# Altium footprint library CONNECTORS.PcbLib: 55 footprints (part 2 of 4)
Each footprint in its own frame and in the unit in brackets; x right, y up, seen from the top. Pads: shape width x height; smd on the part's side, far side on the other; paste and mask are expansions set on the pad; w line width, h text height; cw(c..) or ccw(c..) is an arc to the next point about the centre after c.
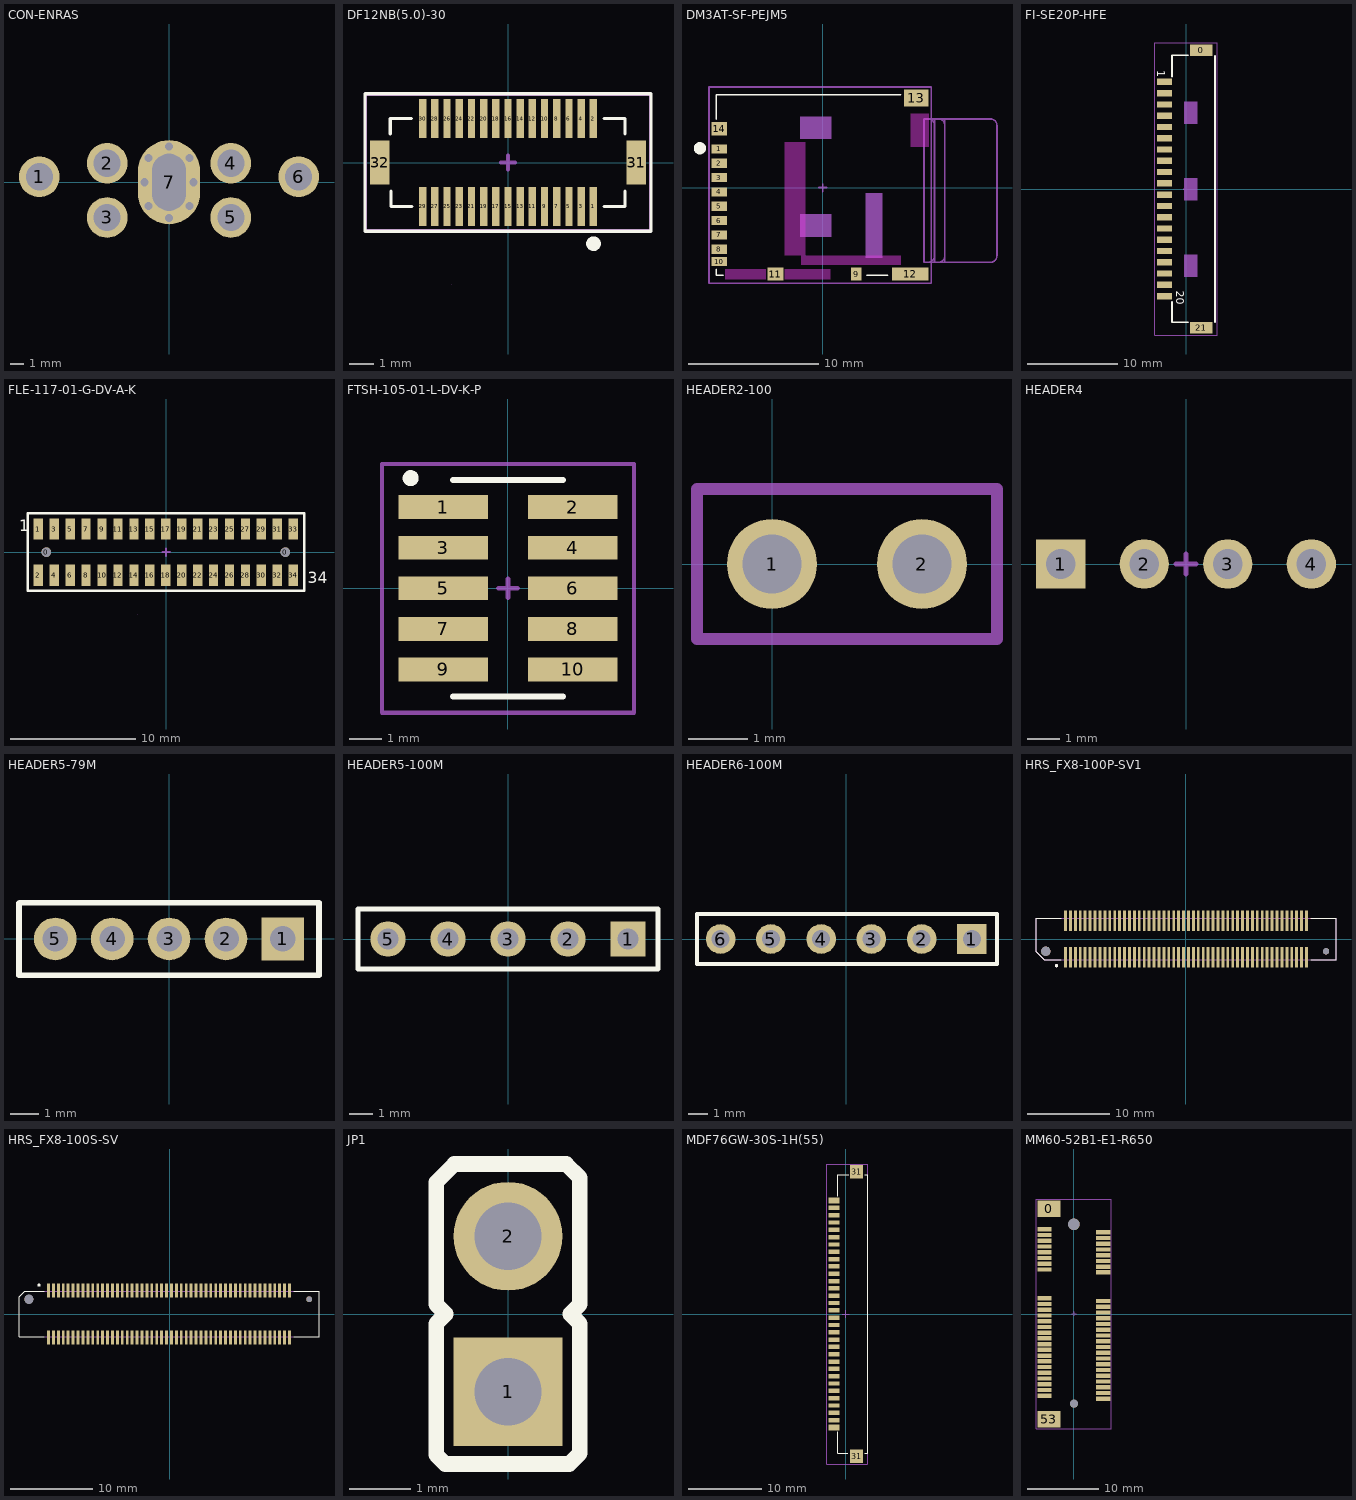
[diagram p1: the footprints below, top view; thin cyan lines are the x and y axes]

## CON-ENRAS [mm]
pads (15):
  round 3 hole 2: 1(-9.56,0.4) 2(-4.56,1.4) 3(-4.56,-2.6) 4(4.56,1.4) 5(4.56,-2.6) 6(9.56,0.4)
  round 0 hole 0.6: 7(-1.803,0) 7(-1.524,-1.753) 7(-1.524,1.778) 7(0,-2.642) 7(0,2.642) 7(1.524,-1.753) 7(1.524,1.778) 7(1.803,0)
  oval 4.6x6.2 hole 4.2 slot 2.5 at 0 deg: 7(0,0)
Bottom Component Center:
  lines w0.152: -0.5,0 0.5,0 ; 0,-0.5 0,0.5

## DF12NB(5.0)-30 [mm]
pads (32):
  rect 0.3x1.6 smd: 1(3.5,-1.8) 2(3.5,1.8) 3(3,-1.8) 4(3,1.8) 5(2.5,-1.8) 6(2.5,1.8) 7(2,-1.8) 8(2,1.8) 9(1.5,-1.8) 10(1.5,1.8) 11(1,-1.8) 12(1,1.8) 13(0.5,-1.8) 14(0.5,1.8) 15(0,-1.8) 16(0,1.8) 17(-0.5,-1.8) 18(-0.5,1.8) 19(-1,-1.8) 20(-1,1.8) 21(-1.5,-1.8) 22(-1.5,1.8) 23(-2,-1.8) 24(-2,1.8) 25(-2.5,-1.8) 26(-2.5,1.8) 27(-3,-1.8) 28(-3,1.8) 29(-3.5,-1.8) 30(-3.5,1.8)
  rect 0.8x1.8 smd: 31(5.25,0) 32(-5.25,0)
Top Overlay:
  circle w0.4: c3.505,-3.327 r0.1
  lines w0.127: -4.826,1.168 -4.826,1.803 -3.962,1.803 ; -4.801,-1.168 -4.801,-1.803 -3.937,-1.803 ; 3.937,-1.803 4.801,-1.803 4.801,-1.168 ; 3.937,1.803 4.801,1.803 4.801,1.168 ; -5.867,-2.819 -5.867,2.819 5.867,2.819 5.867,-2.819 -5.867,-2.819
Top Assembly (Mech4):
  lines w0.127: -5.842,-2.794 -5.842,2.794 5.842,2.794 5.842,-2.794 -5.842,-2.794
  text ".Designator" at -3.275,-0.4 h1
Top Component Center (Mech11):
  lines w0.15: -0.298,0 0.302,0 ; 0.002,-0.3 0.002,0.3
Mechanical 12:
  lines w0.001: -2.315,-4.991 -2.308,-4.984
3D body "DF12NB(5.0)-30DP.STEP": height 4.3, standoff 0, extent -5.3,-2.3 5.3,2.3

## DM3AT-SF-PEJM5 [mm]
pads (14):
  rect 1.2x0.7 smd: 1(-7.93,2.973) 2(-7.93,1.873) 3(-7.93,0.773) 4(-7.93,-0.327) 5(-7.93,-1.427) 6(-7.93,-2.527) 7(-7.93,-3.627) 8(-7.93,-4.727) 10(-7.93,-5.677)
  rect 0.8x1 smd: 9(2.57,-6.627)
  rect 1.2x1 smd: 11(-3.63,-6.627) 14(-7.93,4.523)
  rect 2.8x1 smd: 12(6.72,-6.627)
  rect 1.9x1.3 smd: 13(7.17,6.873)
Top Layer keep-out:
  region: -2.905,-7.031 -2.905,-6.277 0.575,-6.277 0.575,-7.031
  region: -7.48,-7.04 -7.48,-6.277 -4.38,-6.277 -4.38,-7.04
  region: -1.63,-5.933 -1.63,-5.227 5.985,-5.227 5.985,-5.933
  region: -2.93,-5.177 -2.93,3.473 -1.326,3.473 -1.326,-5.177
  region: 6.77,3.124 6.77,5.673 8.127,5.673 8.127,3.124
Top Overlay:
  circle w0.5: c-9.43,3.023 r0.22
  lines w0.127: -8.18,-6.277 -8.18,-6.727 -7.63,-6.727 ; -8.18,5.273 -8.18,7.123 5.97,7.123 ; 3.37,-6.727 4.97,-6.727
Top Assembly:
  lines w0.127: -8.725,-7.325 8.325,-7.325 8.325,7.725 -8.725,7.725 -8.725,-7.325
  text ".Designator" at -3.925,-0.225 h1.2
Top Component Center:
  lines w0.15: -0.3,-0.002 0.3,-0.002 ; 0,-0.302 0,0.298
Top Glue Points:
  rectangle: -1.73,-3.777 0.67,-2.027
  rectangle: 3.28,-5.402 4.58,-0.402
  rectangle: -1.73,3.723 0.67,5.473
Top Auxiliary Drawings:
  lines w0.127: 7.77,5.273 8.07,5.273 ; 8.075,-5.725 ccw(c8.075,-5.225) 8.575,-5.225 ; 8.075,-5.725 8.575,-5.725 ; 8.075,-5.725 7.775,-5.725 7.775,5.275 8.075,5.275 ; 8.075,5.275 cw(c8.075,4.775) 8.575,4.775 ; 8.075,5.275 8.575,5.275 ; 8.575,-5.725 8.875,-5.725 ; 8.575,-5.725 8.575,-5.225 ; 8.575,-5.225 8.575,4.775 ; 8.575,4.775 8.575,5.275 ; 8.575,5.275 8.875,5.275 ; 8.875,-5.725 ccw(c8.875,-5.225) 9.375,-5.225 ; 8.875,-5.725 9.375,-5.725 ; 8.875,5.275 cw(c8.875,4.775) 9.375,4.775 ; 8.875,5.275 9.375,5.275 ; 9.375,-5.725 9.375,-5.225 ; 9.375,-5.725 12.875,-5.725 ccw(c12.875,-5.225) 13.375,-5.225 13.375,4.775 ccw(c12.875,4.775) 12.875,5.275 9.375,5.275 ; 9.375,-5.225 9.375,4.775 ; 9.375,4.775 9.375,5.275
3D body "DM3AT-SF-PEJM5.STEP": height 1.63, standoff -0.05, extent -8.144,-6.733 8.006,7.117

## FI-SE20P-HFE [mm]
pads (22):
  rect 2.5x1.25 smd: 0(1.7,15.4) 21(1.7,-15.35)
  rect 1.7x0.7 smd: 1(-2.4,11.9) 2(-2.4,10.65) 3(-2.4,9.4) 4(-2.4,8.15) 5(-2.4,6.9) 6(-2.4,5.65) 7(-2.4,4.4) 8(-2.4,3.15) 9(-2.4,1.9) 10(-2.4,0.65) 11(-2.4,-0.6) 12(-2.4,-1.85) 13(-2.4,-3.1) 14(-2.4,-4.35) 15(-2.4,-5.6) 16(-2.4,-6.85) 17(-2.4,-8.1) 18(-2.4,-9.35) 19(-2.4,-10.6) 20(-2.4,-11.85)
Top Overlay:
  lines w0.2: -1.55,-12.475 -1.55,-14.75 0.225,-14.75 ; -1.55,12.5 -1.55,14.85 0.225,14.85 ; 3.2,-14.725 3.2,14.75
  text "20" at -1.099,-11.269 h0.9
  text "1" at -3.203,13.193 h0.9
Top Assembly:
  lines w0.127: -3.45,-16.175 3.425,-16.175 3.425,16.225 -3.45,16.225 -3.45,-16.175
  text ".Designator" at 0.35,4.525 h1
Top Component Center:
  lines w0.15: -0.3,-0.002 0.3,-0.002 ; 0,-0.302 0,0.298
Top Glue Points:
  rectangle: -0.25,-1.25 1.25,1.25
  rectangle: -0.25,7.25 1.25,9.75
  rectangle: -0.25,-9.75 1.25,-7.25
3D body "FI-SE20P-HFE.STEP": height 2.09, standoff -0.02, extent -2.35,-15.375 3,15.375

## FLE-117-01-G-DV-A-K [mil]
pads (36):
  round 30 hole 30 unplated: 0(-375.98,0) 0(374.02,0)
  rect 29x66 smd: 1(-400.98,72.5) 2(-400.98,-72.5) 3(-350.98,72.5) 4(-350.98,-72.5) 5(-300.98,72.5) 6(-300.98,-72.5) 7(-250.98,72.5) 8(-250.98,-72.5) 9(-200.98,72.5) 10(-200.98,-72.5) 11(-150.98,72.5) 12(-150.98,-72.5) 13(-100.98,72.5) 14(-100.98,-72.5) 15(-50.98,72.5) 16(-50.98,-72.5) 17(-0.98,72.5) 18(-0.98,-72.5) 19(49.02,72.5) 20(49.02,-72.5) 21(99.02,72.5) 22(99.02,-72.5) 23(149.02,72.5) 24(149.02,-72.5) 25(199.02,72.5) 26(199.02,-72.5) 27(249.02,72.5) 28(249.02,-72.5) 29(299.02,72.5) 30(299.02,-72.5) 31(349.02,72.5) 32(349.02,-72.5) 33(399.02,72.5) 34(399.02,-72.5)
Top Overlay:
  lines w7.87: -434.06,-121.06 433.07,-121.06 433.07,122.05 -434.06,122.05 -434.06,-121.06
  text "1" at -461.61,64.96 h35
  text "34" at 444.88,-97.44 h35
Top Assembly:
  lines w5: -434.06,-121.06 433.07,-121.06 433.07,122.05 -434.06,122.05 -434.06,-121.06
  text ".Designator" at -128.94,-15.75 h39.37
Top Component Center:
  lines w5.91: -11.73,0 11.89,0 ; 0.08,-11.81 0.08,11.81
Mechanical 12:
  lines w0.04: -91.14,-196.48 -90.88,-196.22
3D body "FLE-117-01-G-DV-A-K.stp": height 182.91, standoff -24.09, extent -427.25,-90.45 427.25,90.45

## FTSH-105-01-L-DV-K-P [mm]
pads (10):
  rect 2.8x0.75 smd: 1(-2.03,2.54) 2(2.03,2.54) 3(-2.03,1.27) 4(2.03,1.27) 5(-2.03,0) 6(2.03,0) 7(-2.03,-1.27) 8(2.03,-1.27) 9(-2.03,-2.54) 10(2.03,-2.54)
Top Overlay:
  circle w0.25: c-3.05,3.45 r0.125
  lines w0.2: -1.715,-3.391 1.715,-3.391 ; -1.715,3.391 1.715,3.391
Top Assembly:
  lines w0.127: -3.95,-3.9 -3.95,3.9 3.95,3.9 3.95,-3.9 -3.95,-3.9
  text ".Designator" at -0.381,1.524 h1
Top Component Center:
  lines w0.15: -0.298,0 0.302,0 ; 0.002,-0.3 0.002,0.3
Mechanical 12:
  lines w0.001: -2.54,-1.08 -1.715,-1.08 ; -2.54,1.08 -1.715,1.08 ; -1.715,-3.391 1.715,-3.391 ; -1.715,3.384 -1.708,3.391 1.715,3.391
Mechanical 13:
  lines w0.1: -2.54,-1.08 -1.715,-1.08 ; -2.54,1.08 -1.715,1.08 ; -1.715,-3.391 1.715,-3.391 ; -1.708,3.391 1.715,3.391 ; 1.708,-3.391 1.715,-3.384
3D body "FTSH-105-01-L-DV-K-P.stp": height 6.98, standoff -0.01, extent -2.921,-3.175 2.921,3.175

## HEADER2-100 [mil]
pads (2):
  round 60 hole 39.37: 1(0,0) 2(100,0)
Top Assembly:
  lines w7.87: -50,-50 -50,50 150,50 150,-50 -50,-50
3D body "61300211121_rev1.stp": height 336.22, standoff -118.11, extent -49.99,-50 150.01,50

## HEADER4 [mm]
pads (4):
  rect 1.5x1.5 hole 0.9: 1(-3.812,0)
  round 1.5 hole 0.9: 2(-1.272,0) 3(1.268,0) 4(3.808,0)
Top Component Center:
  lines w0.15: -0.302,0 0.298,0 ; -0.002,-0.3 -0.002,0.3

## HEADER5-79M [mm]
pads (5):
  rect 1.5x1.5 hole 0.9: 1(4,0)
  round 1.5 hole 0.9: 2(2,0) 3(0,0) 4(-2,0) 5(-4,0)
Top Overlay:
  lines w0.2: -5.275,-1.275 5.27,-1.275 5.27,1.27 -5.255,1.27 -5.275,1.25 -5.275,-1.275

## HEADER5-100M [mm]
pads (5):
  rect 1.5x1.5 hole 0.9: 1(5.08,0)
  round 1.5 hole 0.9: 2(2.54,0) 3(0,0) 4(-2.54,0) 5(-5.08,0)
Top Overlay:
  lines w0.2: -6.35,-1.27 6.35,-1.27 6.35,1.27 -6.35,1.27 -6.35,-1.27

## HEADER6-100M [mm]
pads (6):
  rect 1.5x1.5 hole 0.9: 1(6.35,0)
  round 1.5 hole 0.9: 2(3.81,0) 3(1.27,0) 4(-1.27,0) 5(-3.81,0) 6(-6.35,0)
Top Overlay:
  lines w0.2: -7.544,-1.27 -7.544,1.27 7.62,1.27 7.62,-1.27 -7.544,-1.27

## HRS_FX8-100P-SV1 [mm] "100 Position Connector Header, Outer Shroud Contacts Surface Mount Gold"
pads (102):
  rect 0.35x2.45 smd: 1(-14.7,-2.225) 2(-14.7,2.225) 3(-14.1,-2.225) 4(-14.1,2.225) 5(-13.5,-2.225) 6(-13.5,2.225) 7(-12.9,-2.225) 8(-12.9,2.225) 9(-12.3,-2.225) 10(-12.3,2.225) 11(-11.7,-2.225) 12(-11.7,2.225) 13(-11.1,-2.225) 14(-11.1,2.225) 15(-10.5,-2.225) 16(-10.5,2.225) 17(-9.9,-2.225) 18(-9.9,2.225) 19(-9.3,-2.225) 20(-9.3,2.225) 21(-8.7,-2.225) 22(-8.7,2.225) 23(-8.1,-2.225) 24(-8.1,2.225) 25(-7.5,-2.225) 26(-7.5,2.225) 27(-6.9,-2.225) 28(-6.9,2.225) 29(-6.3,-2.225) 30(-6.3,2.225) 31(-5.7,-2.225) 32(-5.7,2.225) 33(-5.1,-2.225) 34(-5.1,2.225) 35(-4.5,-2.225) 36(-4.5,2.225) 37(-3.9,-2.225) 38(-3.9,2.225) 39(-3.3,-2.225) 40(-3.3,2.225) 41(-2.7,-2.225) 42(-2.7,2.225) 43(-2.1,-2.225) 44(-2.1,2.225) 45(-1.5,-2.225) 46(-1.5,2.225) 47(-0.9,-2.225) 48(-0.9,2.225) 49(-0.3,-2.225) 50(-0.3,2.225) 51(0.3,-2.225) 52(0.3,2.225) 53(0.9,-2.225) 54(0.9,2.225) 55(1.5,-2.225) 56(1.5,2.225) 57(2.1,-2.225) 58(2.1,2.225) 59(2.7,-2.225) 60(2.7,2.225) 61(3.3,-2.225) 62(3.3,2.225) 63(3.9,-2.225) 64(3.9,2.225) 65(4.5,-2.225) 66(4.5,2.225) 67(5.1,-2.225) 68(5.1,2.225) 69(5.7,-2.225) 70(5.7,2.225) 71(6.3,-2.225) 72(6.3,2.225) 73(6.9,-2.225) 74(6.9,2.225) 75(7.5,-2.225) 76(7.5,2.225) 77(8.1,-2.225) 78(8.1,2.225) 79(8.7,-2.225) 80(8.7,2.225) 81(9.3,-2.225) 82(9.3,2.225) 83(9.9,-2.225) 84(9.9,2.225) 85(10.5,-2.225) 86(10.5,2.225) 87(11.1,-2.225) 88(11.1,2.225) 89(11.7,-2.225) 90(11.7,2.225) 91(12.3,-2.225) 92(12.3,2.225) 93(12.9,-2.225) 94(12.9,2.225) 95(13.5,-2.225) 96(13.5,2.225) 97(14.1,-2.225) 98(14.1,2.225) 99(14.7,-2.225) 100(14.7,2.225)
  round 1.15 hole 1.15 unplated: ""(-17.1,-1.5)
  round 0.75 hole 0.75 unplated: ""(17.1,-1.5)
Top Layer:
  lines w0.1: 15.212,2.552 15.852,2.552
Top Overlay:
  circle w0.2: c-15.798,-3.248 r0.1
  lines w0.127: -15.21,-2.55 -17.3,-2.55 -18.3,-1.55 -18.3,2.55 -15.21,2.55 ; 15.21,-2.55 18.3,-2.55 18.3,2.55 15.21,2.55
Mechanical 13:
  circle w0.2: c-15.798,-3.248 r0.1
  lines w0.127: -18.3,-1.55 -17.3,-2.55 18.3,-2.55 18.3,2.55 -18.3,2.55 -18.3,-1.55
3D body "FX8-100P-SV1.STEP": height 3.77, standoff -0.89, extent -18.3,-3.25 18.3,3.25

## HRS_FX8-100S-SV [mm] "100 Position Connector Receptacle, Center Strip Contacts Surface Mount Gold"
pads (102):
  rect 0.35x1.7 smd: 1(-14.813,2.85) 2(-14.813,-2.85) 3(-14.212,2.85) 4(-14.212,-2.85) 5(-13.613,2.85) 6(-13.613,-2.85) 7(-13.013,2.85) 8(-13.013,-2.85) 9(-12.412,2.85) 10(-12.412,-2.85) 11(-11.813,2.85) 12(-11.813,-2.85) 13(-11.212,2.85) 14(-11.212,-2.85) 15(-10.613,2.85) 16(-10.613,-2.85) 17(-10.012,2.85) 18(-10.012,-2.85) 19(-9.413,2.85) 20(-9.413,-2.85) 21(-8.812,2.85) 22(-8.812,-2.85) 23(-8.213,2.85) 24(-8.213,-2.85) 25(-7.612,2.85) 26(-7.612,-2.85) 27(-7.013,2.85) 28(-7.013,-2.85) 29(-6.412,2.85) 30(-6.412,-2.85) 31(-5.813,2.85) 32(-5.813,-2.85) 33(-5.212,2.85) 34(-5.212,-2.85) 35(-4.613,2.85) 36(-4.613,-2.85) 37(-4.012,2.85) 38(-4.012,-2.85) 39(-3.413,2.85) 40(-3.413,-2.85) 41(-2.812,2.85) 42(-2.812,-2.85) 43(-2.213,2.85) 44(-2.213,-2.85) 45(-1.613,2.85) 46(-1.613,-2.85) 47(-1.012,2.85) 48(-1.012,-2.85) 49(-0.413,2.85) 50(-0.413,-2.85) 51(0.188,2.85) 52(0.188,-2.85) 53(0.787,2.85) 54(0.787,-2.85) 55(1.388,2.85) 56(1.388,-2.85) 57(1.987,2.85) 58(1.987,-2.85) 59(2.588,2.85) 60(2.588,-2.85) 61(3.187,2.85) 62(3.187,-2.85) 63(3.788,2.85) 64(3.788,-2.85) 65(4.387,2.85) 66(4.387,-2.85) 67(4.988,2.85) 68(4.988,-2.85) 69(5.587,2.85) 70(5.587,-2.85) 71(6.188,2.85) 72(6.188,-2.85) 73(6.787,2.85) 74(6.787,-2.85) 75(7.388,2.85) 76(7.388,-2.85) 77(7.987,2.85) 78(7.987,-2.85) 79(8.587,2.85) 80(8.587,-2.85) 81(9.188,2.85) 82(9.188,-2.85) 83(9.787,2.85) 84(9.787,-2.85) 85(10.388,2.85) 86(10.388,-2.85) 87(10.987,2.85) 88(10.987,-2.85) 89(11.588,2.85) 90(11.588,-2.85) 91(12.187,2.85) 92(12.187,-2.85) 93(12.788,2.85) 94(12.788,-2.85) 95(13.387,2.85) 96(13.387,-2.85) 97(13.988,2.85) 98(13.988,-2.85) 99(14.587,2.85) 100(14.587,-2.85)
  round 1.1 hole 1.1 unplated: ""(-17.213,1.8)
  round 0.7 hole 0.7 unplated: ""(16.987,1.8)
Top Overlay:
  circle w0.2: c-15.975,3.525 r0.1
  lines w0.127: -15.312,-2.8 -18.413,-2.8 -18.413,2.1 -17.712,2.8 -15.312,2.8 ; 15.088,-2.8 18.188,-2.8 18.188,2.8 15.088,2.8
Mechanical 13:
  lines w0.127: -15.312,-2.8 15.088,-2.8 ; -15.312,2.8 15.088,2.8
3D body "FX8-100S-SV--3DModel-STEP-1.STEP": height 2.15, standoff -0.85, extent -18.416,-3.5 18.184,3.5

## JP1 [mil]
height 72.83
pads (2):
  rect 70x70 hole 43.31: 1(0,-50)
  round 70 hole 43.31: 2(0,50)
Top Overlay:
  rectangle: -11.99,-62 12.01,-38
  rectangle: -11.99,38 12.01,62
  lines w10: -46.26,-90.55 -40.35,-96.46 39.37,-96.46 46.26,-89.57 46.26,-6.26 40,0 46.26,6.26 46.26,87.6 37.4,96.46 -34.45,96.46 -46.26,84.65 -46.26,6.26 -40,0 -46.26,-6.26 -46.26,-90.55

## MDF76GW-30S-1H(55) [mm]
pads (34):
  rect 1.5x0.6 smd: 1(-1.625,-14.5) 2(-1.625,-13.5) 3(-1.625,-12.5) 4(-1.625,-11.5) 5(-1.625,-10.5) 6(-1.625,-9.5) 7(-1.625,-8.5) 8(-1.625,-7.5) 9(-1.625,-6.5) 10(-1.625,-5.5) 11(-1.625,-4.5) 12(-1.625,-3.5) 13(-1.625,-2.5) 14(-1.625,-1.5) 15(-1.625,-0.5) 16(-1.625,0.5) 17(-1.625,1.5) 18(-1.625,2.5) 19(-1.625,3.5) 20(-1.625,4.5) 21(-1.625,5.5) 22(-1.625,6.5) 23(-1.625,7.5) 24(-1.625,8.5) 25(-1.625,9.5) 26(-1.625,10.5) 27(-1.625,11.5) 28(-1.625,12.5) 29(-1.625,13.5) 30(-1.625,14.5)
  rect 1.5x0.8 smd: 31(-1.625,-15.5) 31(-1.625,15.5)
  rect 1.8x1.8 smd: 31(1.475,-19.45) 31(1.475,19.45)
Top Overlay:
  lines w0.127: -1.1,-16.1 -1.1,-19 0.3,-19 ; -1.1,16.1 -1.1,19 0.4,19 ; 2.6,-19 2.975,-19 2.975,19 2.6,19
Top Assembly:
  lines w0.127: -2.625,-20.5 2.975,-20.5 2.975,20.5 -2.625,20.5 -2.625,15 -2.625,-20.5
Top Component Center:
  lines w0.127: -0.5,0 0.5,0 ; 0,-0.5 0,0.5
3D body "MDF76GW-30S-1H.stp": height 2.35, standoff 0, extent -1.85,-20 2.9,20.05

## MM60-52B1-E1-R650 [mm]
pads (56):
  rect 3.2x2.3 smd: 0(-3.5,14.65) 53(-3.5,-14.65)
  rect 2x0.6 smd: 1(-4.1,11.8) 2(4.1,11.4) 3(-4.1,11) 4(4.1,10.6) 5(-4.1,10.2) 6(4.1,9.8) 7(-4.1,9.4) 8(4.1,9) 9(-4.1,8.6) 10(4.1,8.2) 11(-4.1,7.8) 12(4.1,7.4) 13(-4.1,7) 14(4.1,6.6) 15(-4.1,6.2) 16(4.1,5.8) 17(-4.1,2.2) 18(4.1,1.8) 19(-4.1,1.4) 20(4.1,1) 21(-4.1,0.6) 22(4.1,0.2) 23(-4.1,-0.2) 24(4.1,-0.6) 25(-4.1,-1) 26(4.1,-1.4) 27(-4.1,-1.8) 28(4.1,-2.2) 29(-4.1,-2.6) 30(4.1,-3) 31(-4.1,-3.4) 32(4.1,-3.8) 33(-4.1,-4.2) 34(4.1,-4.6) 35(-4.1,-5) 36(4.1,-5.4) 37(-4.1,-5.8) 38(4.1,-6.2) 39(-4.1,-6.6) 40(4.1,-7) 41(-4.1,-7.4) 42(4.1,-7.8) 43(-4.1,-8.2) 44(4.1,-8.6) 45(-4.1,-9) 46(4.1,-9.4) 47(-4.1,-9.8) 48(4.1,-10.2) 49(-4.1,-10.6) 50(4.1,-11) 51(-4.1,-11.4) 52(4.1,-11.8)
  round 1.1 hole 1.1 unplated: ""(0,-12.5)
  round 1.6 hole 1.6 unplated: ""(0,12.5)
Top Overlay:
Top Assembly:
  lines w0.127: -5.293,-15.975 5.2,-15.975 5.2,15.975 -5.293,15.975 -5.293,-15.975
  text ".Designator" at 1.1,-11.2 h3
Top Component Center:
  lines w0.15: -0.288,0.025 0.312,0.025 ; 0.012,-0.275 0.012,0.325
3D body "MM60-52B1-E1-R650.stp": height 5.8, standoff -0.9, extent -4.993,-14.825 5.007,14.875